# Altium footprint library Connectors.PcbLib: 135 footprints (part 9 of 9)
Each footprint in its own frame and in the unit in brackets; x right, y up, seen from the top. Pads: shape width x height; smd on the part's side, far side on the other; paste and mask are expansions set on the pad; w line width, h text height; cw(c..) or ccw(c..) is an arc to the next point about the centre after c.
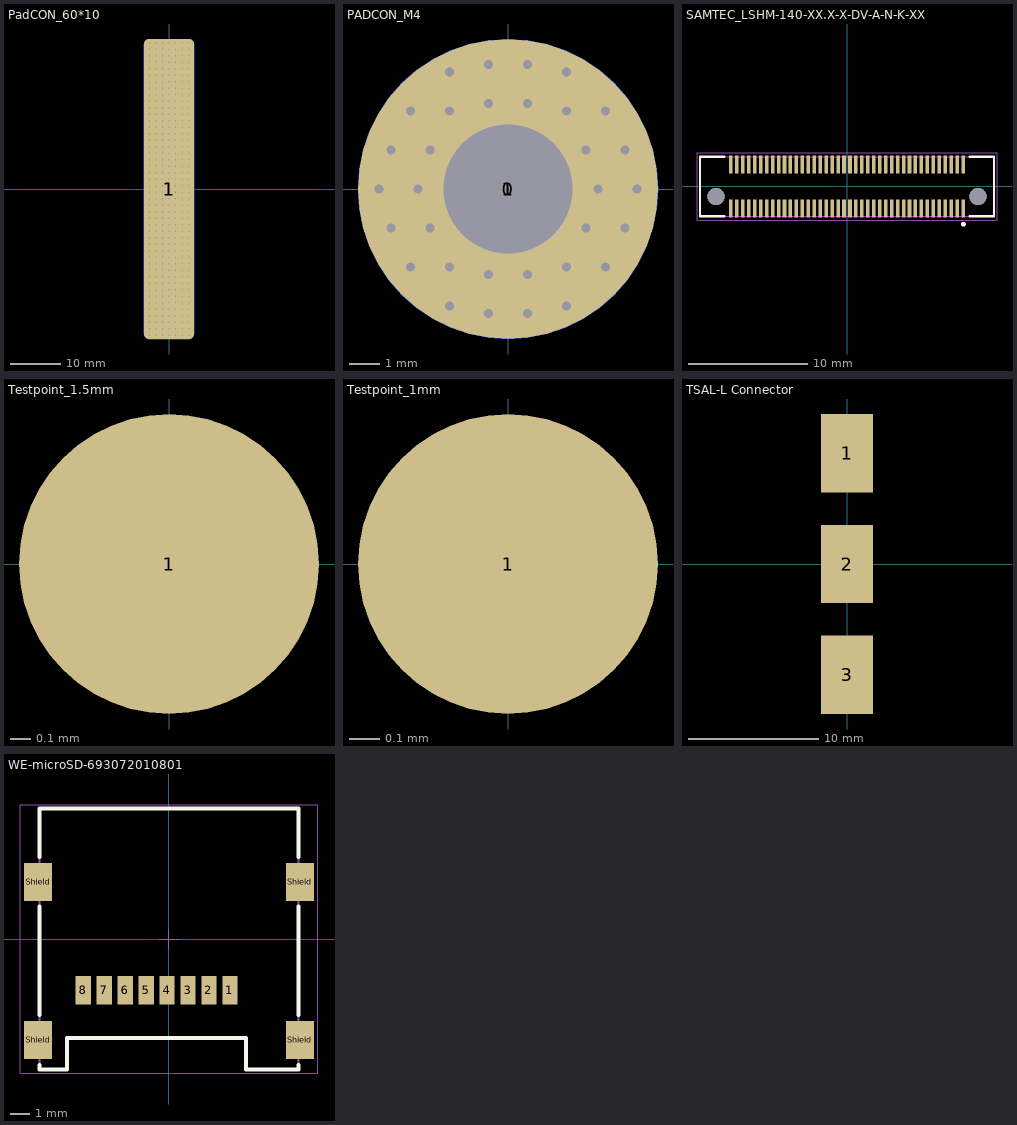
[diagram p8: the footprints below, top view; thin cyan lines are the x and y axes]

## PadCON_60*10 [mm]
pads (2):
  rrect20% 10x60 smd far side: 1(-0.025,0)
  rrect20% 10x60 smd: 1(-0.025,0)
via -0.05,0.625 diameter 0.65 hole 0.3
via 3.875,-29.25 diameter 0.65 hole 0.3
via 3.875,-27.95 diameter 0.65 hole 0.3
via 3.875,-26.65 diameter 0.65 hole 0.3
via 3.875,-25.35 diameter 0.65 hole 0.3
via 3.875,-24.05 diameter 0.65 hole 0.3
via 3.875,-22.75 diameter 0.65 hole 0.3
via 3.875,-21.45 diameter 0.65 hole 0.3
via -3.925,-29.25 diameter 0.65 hole 0.3
via -3.925,-27.95 diameter 0.65 hole 0.3
via -3.925,-26.65 diameter 0.65 hole 0.3
via -3.925,-25.35 diameter 0.65 hole 0.3
via -3.925,-24.05 diameter 0.65 hole 0.3
via -3.925,-22.75 diameter 0.65 hole 0.3
via -3.925,-21.45 diameter 0.65 hole 0.3
via 2.575,-29.25 diameter 0.65 hole 0.3
via 2.575,-27.95 diameter 0.65 hole 0.3
via 2.575,-26.65 diameter 0.65 hole 0.3
via 2.575,-25.35 diameter 0.65 hole 0.3
via 2.575,-24.05 diameter 0.65 hole 0.3
via 2.575,-22.75 diameter 0.65 hole 0.3
via 2.575,-21.45 diameter 0.65 hole 0.3
via -2.625,-29.25 diameter 0.65 hole 0.3
via -1.325,-29.25 diameter 0.65 hole 0.3
via -0.025,-29.25 diameter 0.65 hole 0.3
via 1.275,-29.25 diameter 0.65 hole 0.3
via -2.625,-27.95 diameter 0.65 hole 0.3
via -1.325,-27.95 diameter 0.65 hole 0.3
via -0.025,-27.95 diameter 0.65 hole 0.3
via 1.275,-27.95 diameter 0.65 hole 0.3
via -2.625,-26.65 diameter 0.65 hole 0.3
via -1.325,-26.65 diameter 0.65 hole 0.3
via -0.025,-26.65 diameter 0.65 hole 0.3
via 1.275,-26.65 diameter 0.65 hole 0.3
via -2.625,-25.35 diameter 0.65 hole 0.3
via -1.325,-25.35 diameter 0.65 hole 0.3
via -0.025,-25.35 diameter 0.65 hole 0.3
via 1.275,-25.35 diameter 0.65 hole 0.3
via -2.625,-24.05 diameter 0.65 hole 0.3
via -1.325,-24.05 diameter 0.65 hole 0.3
via -0.025,-24.05 diameter 0.65 hole 0.3
via 1.275,-24.05 diameter 0.65 hole 0.3
via -2.625,-22.75 diameter 0.65 hole 0.3
via -1.325,-22.75 diameter 0.65 hole 0.3
via -0.025,-22.75 diameter 0.65 hole 0.3
via 1.275,-22.75 diameter 0.65 hole 0.3
via -2.625,-21.45 diameter 0.65 hole 0.3
via -1.325,-21.45 diameter 0.65 hole 0.3
via -0.025,-21.45 diameter 0.65 hole 0.3
via 1.275,-21.45 diameter 0.65 hole 0.3
via 3.875,-20.15 diameter 0.65 hole 0.3
via 3.875,-18.85 diameter 0.65 hole 0.3
via 3.875,-17.55 diameter 0.65 hole 0.3
via 3.875,-16.25 diameter 0.65 hole 0.3
via 3.875,-14.95 diameter 0.65 hole 0.3
via 3.875,-13.65 diameter 0.65 hole 0.3
via 3.875,-12.35 diameter 0.65 hole 0.3
via 3.875,-11.05 diameter 0.65 hole 0.3
via -3.925,-20.15 diameter 0.65 hole 0.3
via -3.925,-18.85 diameter 0.65 hole 0.3
via -3.925,-17.55 diameter 0.65 hole 0.3
via -3.925,-16.25 diameter 0.65 hole 0.3
via -3.925,-14.95 diameter 0.65 hole 0.3
via -3.925,-13.65 diameter 0.65 hole 0.3
via -3.925,-12.35 diameter 0.65 hole 0.3
via -3.925,-11.05 diameter 0.65 hole 0.3
via 2.575,-20.15 diameter 0.65 hole 0.3
via 2.575,-18.85 diameter 0.65 hole 0.3
via 2.575,-17.55 diameter 0.65 hole 0.3
via 2.575,-16.25 diameter 0.65 hole 0.3
via 2.575,-14.95 diameter 0.65 hole 0.3
via 2.575,-13.65 diameter 0.65 hole 0.3
via 2.575,-12.35 diameter 0.65 hole 0.3
via 2.575,-11.05 diameter 0.65 hole 0.3
via -2.625,-20.15 diameter 0.65 hole 0.3
via -1.325,-20.15 diameter 0.65 hole 0.3
via -0.025,-20.15 diameter 0.65 hole 0.3
via 1.275,-20.15 diameter 0.65 hole 0.3
via -2.625,-18.85 diameter 0.65 hole 0.3
via -1.325,-18.85 diameter 0.65 hole 0.3
via -0.025,-18.85 diameter 0.65 hole 0.3
via 1.275,-18.85 diameter 0.65 hole 0.3
via -2.625,-17.55 diameter 0.65 hole 0.3
via -1.325,-17.55 diameter 0.65 hole 0.3
via -0.025,-17.55 diameter 0.65 hole 0.3
via 1.275,-17.55 diameter 0.65 hole 0.3
via -2.625,-16.25 diameter 0.65 hole 0.3
via -1.325,-16.25 diameter 0.65 hole 0.3
via -0.025,-16.25 diameter 0.65 hole 0.3
via 1.275,-16.25 diameter 0.65 hole 0.3
via -2.625,-14.95 diameter 0.65 hole 0.3
via -1.325,-14.95 diameter 0.65 hole 0.3
via -0.025,-14.95 diameter 0.65 hole 0.3
via 1.275,-14.95 diameter 0.65 hole 0.3
via -2.625,-13.65 diameter 0.65 hole 0.3
via -1.325,-13.65 diameter 0.65 hole 0.3
via -0.025,-13.65 diameter 0.65 hole 0.3
via 1.275,-13.65 diameter 0.65 hole 0.3
via -2.625,-12.35 diameter 0.65 hole 0.3
via -1.325,-12.35 diameter 0.65 hole 0.3
via -0.025,-12.35 diameter 0.65 hole 0.3
via 1.275,-12.35 diameter 0.65 hole 0.3
via -2.625,-11.05 diameter 0.65 hole 0.3
via -1.325,-11.05 diameter 0.65 hole 0.3
via -0.025,-11.05 diameter 0.65 hole 0.3
via 1.275,-11.05 diameter 0.65 hole 0.3
via 3.875,-9.75 diameter 0.65 hole 0.3
via 3.875,-8.45 diameter 0.65 hole 0.3
via 3.875,-7.15 diameter 0.65 hole 0.3
via 3.875,-5.85 diameter 0.65 hole 0.3
via 3.875,-4.55 diameter 0.65 hole 0.3
via 3.875,-3.25 diameter 0.65 hole 0.3
via 3.875,-1.95 diameter 0.65 hole 0.3
via 3.875,-0.65 diameter 0.65 hole 0.3
via -3.925,-9.75 diameter 0.65 hole 0.3
via -3.925,-8.45 diameter 0.65 hole 0.3
via -3.925,-7.15 diameter 0.65 hole 0.3
via -3.925,-5.85 diameter 0.65 hole 0.3
via -3.925,-4.55 diameter 0.65 hole 0.3
via -3.925,-3.25 diameter 0.65 hole 0.3
via -3.925,-1.95 diameter 0.65 hole 0.3
via -3.925,-0.65 diameter 0.65 hole 0.3
via 2.575,-9.75 diameter 0.65 hole 0.3
via 2.575,-8.45 diameter 0.65 hole 0.3
via 2.575,-7.15 diameter 0.65 hole 0.3
via 2.575,-5.85 diameter 0.65 hole 0.3
via 2.575,-4.55 diameter 0.65 hole 0.3
via 2.575,-3.25 diameter 0.65 hole 0.3
via 2.575,-1.95 diameter 0.65 hole 0.3
via 2.575,-0.65 diameter 0.65 hole 0.3
via -2.625,-9.75 diameter 0.65 hole 0.3
via -1.325,-9.75 diameter 0.65 hole 0.3
via -0.025,-9.75 diameter 0.65 hole 0.3
via 1.275,-9.75 diameter 0.65 hole 0.3
via -2.625,-8.45 diameter 0.65 hole 0.3
via -1.325,-8.45 diameter 0.65 hole 0.3
via -0.025,-8.45 diameter 0.65 hole 0.3
via 1.275,-8.45 diameter 0.65 hole 0.3
via -2.625,-7.15 diameter 0.65 hole 0.3
via -1.325,-7.15 diameter 0.65 hole 0.3
via -0.025,-7.15 diameter 0.65 hole 0.3
via 1.275,-7.15 diameter 0.65 hole 0.3
via -2.625,-5.85 diameter 0.65 hole 0.3
via -1.325,-5.85 diameter 0.65 hole 0.3
via -0.025,-5.85 diameter 0.65 hole 0.3
via 1.275,-5.85 diameter 0.65 hole 0.3
via -2.625,-4.55 diameter 0.65 hole 0.3
via -1.325,-4.55 diameter 0.65 hole 0.3
via -0.025,-4.55 diameter 0.65 hole 0.3
via 1.275,-4.55 diameter 0.65 hole 0.3
via -2.625,-3.25 diameter 0.65 hole 0.3
via -1.325,-3.25 diameter 0.65 hole 0.3
via -0.025,-3.25 diameter 0.65 hole 0.3
via 1.275,-3.25 diameter 0.65 hole 0.3
via -2.625,-1.95 diameter 0.65 hole 0.3
via -1.325,-1.95 diameter 0.65 hole 0.3
via -0.025,-1.95 diameter 0.65 hole 0.3
via 1.275,-1.95 diameter 0.65 hole 0.3
via -2.625,-0.65 diameter 0.65 hole 0.3
via -1.325,-0.65 diameter 0.65 hole 0.3
via -0.025,-0.65 diameter 0.65 hole 0.3
via 1.275,-0.65 diameter 0.65 hole 0.3
via 3.875,0.65 diameter 0.65 hole 0.3
via 3.875,1.95 diameter 0.65 hole 0.3
via 3.875,3.25 diameter 0.65 hole 0.3
via 3.875,4.55 diameter 0.65 hole 0.3
via 3.875,5.85 diameter 0.65 hole 0.3
via 3.875,7.15 diameter 0.65 hole 0.3
via 3.875,8.45 diameter 0.65 hole 0.3
via 3.875,9.75 diameter 0.65 hole 0.3
via -3.925,0.65 diameter 0.65 hole 0.3
via -3.925,1.95 diameter 0.65 hole 0.3
via -3.925,3.25 diameter 0.65 hole 0.3
via -3.925,4.55 diameter 0.65 hole 0.3
via -3.925,5.85 diameter 0.65 hole 0.3
via -3.925,7.15 diameter 0.65 hole 0.3
via -3.925,8.45 diameter 0.65 hole 0.3
via -3.925,9.75 diameter 0.65 hole 0.3
via 2.575,0.65 diameter 0.65 hole 0.3
via 2.575,1.95 diameter 0.65 hole 0.3
via 2.575,3.25 diameter 0.65 hole 0.3
via 2.575,4.55 diameter 0.65 hole 0.3
via 2.575,5.85 diameter 0.65 hole 0.3
via 2.575,7.15 diameter 0.65 hole 0.3
via 2.575,8.45 diameter 0.65 hole 0.3
via 2.575,9.75 diameter 0.65 hole 0.3
via -2.625,0.65 diameter 0.65 hole 0.3
via -1.325,0.65 diameter 0.65 hole 0.3
via 1.275,0.65 diameter 0.65 hole 0.3
via -2.625,1.95 diameter 0.65 hole 0.3
via -1.325,1.95 diameter 0.65 hole 0.3
via -0.025,1.95 diameter 0.65 hole 0.3
via 1.275,1.95 diameter 0.65 hole 0.3
via -2.625,3.25 diameter 0.65 hole 0.3
via -1.325,3.25 diameter 0.65 hole 0.3
via -0.025,3.25 diameter 0.65 hole 0.3
via 1.275,3.25 diameter 0.65 hole 0.3
via -2.625,4.55 diameter 0.65 hole 0.3
via -1.325,4.55 diameter 0.65 hole 0.3
via -0.025,4.55 diameter 0.65 hole 0.3
via 1.275,4.55 diameter 0.65 hole 0.3
via -2.625,5.85 diameter 0.65 hole 0.3
via -1.325,5.85 diameter 0.65 hole 0.3
via -0.025,5.85 diameter 0.65 hole 0.3
via 1.275,5.85 diameter 0.65 hole 0.3
via -2.625,7.15 diameter 0.65 hole 0.3
via -1.325,7.15 diameter 0.65 hole 0.3
via -0.025,7.15 diameter 0.65 hole 0.3
via 1.275,7.15 diameter 0.65 hole 0.3
via -2.625,8.45 diameter 0.65 hole 0.3
via -1.325,8.45 diameter 0.65 hole 0.3
via -0.025,8.45 diameter 0.65 hole 0.3
via 1.275,8.45 diameter 0.65 hole 0.3
via -2.625,9.75 diameter 0.65 hole 0.3
via -1.325,9.75 diameter 0.65 hole 0.3
via -0.025,9.75 diameter 0.65 hole 0.3
via 1.275,9.75 diameter 0.65 hole 0.3
via 3.875,11.05 diameter 0.65 hole 0.3
via 3.875,12.35 diameter 0.65 hole 0.3
via 3.875,13.65 diameter 0.65 hole 0.3
via 3.875,14.95 diameter 0.65 hole 0.3
via 3.875,16.25 diameter 0.65 hole 0.3
via 3.875,17.55 diameter 0.65 hole 0.3
via 3.875,18.85 diameter 0.65 hole 0.3
via 3.875,20.15 diameter 0.65 hole 0.3
via -3.925,11.05 diameter 0.65 hole 0.3
via -3.925,12.35 diameter 0.65 hole 0.3
via -3.925,13.65 diameter 0.65 hole 0.3
via -3.925,14.95 diameter 0.65 hole 0.3
via -3.925,16.25 diameter 0.65 hole 0.3
via -3.925,17.55 diameter 0.65 hole 0.3
via -3.925,18.85 diameter 0.65 hole 0.3
via -3.925,20.15 diameter 0.65 hole 0.3
via 2.575,11.05 diameter 0.65 hole 0.3
via 2.575,12.35 diameter 0.65 hole 0.3
via 2.575,13.65 diameter 0.65 hole 0.3
via 2.575,14.95 diameter 0.65 hole 0.3
via 2.575,16.25 diameter 0.65 hole 0.3
via 2.575,17.55 diameter 0.65 hole 0.3
via 2.575,18.85 diameter 0.65 hole 0.3
via 2.575,20.15 diameter 0.65 hole 0.3
via -2.625,11.05 diameter 0.65 hole 0.3
via -1.325,11.05 diameter 0.65 hole 0.3
via -0.025,11.05 diameter 0.65 hole 0.3
via 1.275,11.05 diameter 0.65 hole 0.3
via -2.625,12.35 diameter 0.65 hole 0.3
via -1.325,12.35 diameter 0.65 hole 0.3
via -0.025,12.35 diameter 0.65 hole 0.3
via 1.275,12.35 diameter 0.65 hole 0.3
via -2.625,13.65 diameter 0.65 hole 0.3
via -1.325,13.65 diameter 0.65 hole 0.3
via -0.025,13.65 diameter 0.65 hole 0.3
via 1.275,13.65 diameter 0.65 hole 0.3
via -2.625,14.95 diameter 0.65 hole 0.3
via -1.325,14.95 diameter 0.65 hole 0.3
via -0.025,14.95 diameter 0.65 hole 0.3
via 1.275,14.95 diameter 0.65 hole 0.3
via -2.625,16.25 diameter 0.65 hole 0.3
via -1.325,16.25 diameter 0.65 hole 0.3
via -0.025,16.25 diameter 0.65 hole 0.3
via 1.275,16.25 diameter 0.65 hole 0.3
via -2.625,17.55 diameter 0.65 hole 0.3
via -1.325,17.55 diameter 0.65 hole 0.3
via -0.025,17.55 diameter 0.65 hole 0.3
via 1.275,17.55 diameter 0.65 hole 0.3
via -2.625,18.85 diameter 0.65 hole 0.3
via -1.325,18.85 diameter 0.65 hole 0.3
via -0.025,18.85 diameter 0.65 hole 0.3
via 1.275,18.85 diameter 0.65 hole 0.3
via -2.625,20.15 diameter 0.65 hole 0.3
via -1.325,20.15 diameter 0.65 hole 0.3
via -0.025,20.15 diameter 0.65 hole 0.3
via 1.275,20.15 diameter 0.65 hole 0.3
via 3.875,21.45 diameter 0.65 hole 0.3
via 3.875,22.75 diameter 0.65 hole 0.3
via 3.875,24.05 diameter 0.65 hole 0.3
via 3.875,25.35 diameter 0.65 hole 0.3
via 3.875,26.65 diameter 0.65 hole 0.3
via 3.875,27.95 diameter 0.65 hole 0.3
via 3.875,29.25 diameter 0.65 hole 0.3
via -3.925,21.45 diameter 0.65 hole 0.3
via -3.925,22.75 diameter 0.65 hole 0.3
via -3.925,24.05 diameter 0.65 hole 0.3
via -3.925,25.35 diameter 0.65 hole 0.3
via -3.925,26.65 diameter 0.65 hole 0.3
via -3.925,27.95 diameter 0.65 hole 0.3
via -3.925,29.25 diameter 0.65 hole 0.3
via 2.575,21.45 diameter 0.65 hole 0.3
via 2.575,22.75 diameter 0.65 hole 0.3
via 2.575,24.05 diameter 0.65 hole 0.3
via 2.575,25.35 diameter 0.65 hole 0.3
via 2.575,26.65 diameter 0.65 hole 0.3
via 2.575,27.95 diameter 0.65 hole 0.3
via 2.575,29.25 diameter 0.65 hole 0.3
via -2.625,21.45 diameter 0.65 hole 0.3
via -1.325,21.45 diameter 0.65 hole 0.3
via -0.025,21.45 diameter 0.65 hole 0.3
via 1.275,21.45 diameter 0.65 hole 0.3
via -2.625,22.75 diameter 0.65 hole 0.3
via -1.325,22.75 diameter 0.65 hole 0.3
via -0.025,22.75 diameter 0.65 hole 0.3
via 1.275,22.75 diameter 0.65 hole 0.3
via -2.625,24.05 diameter 0.65 hole 0.3
via -1.325,24.05 diameter 0.65 hole 0.3
via -0.025,24.05 diameter 0.65 hole 0.3
via 1.275,24.05 diameter 0.65 hole 0.3
via -2.625,25.35 diameter 0.65 hole 0.3
via -1.325,25.35 diameter 0.65 hole 0.3
via -0.025,25.35 diameter 0.65 hole 0.3
via 1.275,25.35 diameter 0.65 hole 0.3
via -2.625,26.65 diameter 0.65 hole 0.3
via -1.325,26.65 diameter 0.65 hole 0.3
via -0.025,26.65 diameter 0.65 hole 0.3
via 1.275,26.65 diameter 0.65 hole 0.3
via -2.625,27.95 diameter 0.65 hole 0.3
via -1.325,27.95 diameter 0.65 hole 0.3
via -0.025,27.95 diameter 0.65 hole 0.3
via 1.275,27.95 diameter 0.65 hole 0.3
via -2.625,29.25 diameter 0.65 hole 0.3
via -1.325,29.25 diameter 0.65 hole 0.3
via -0.025,29.25 diameter 0.65 hole 0.3
via 1.275,29.25 diameter 0.65 hole 0.3

## PADCON_M4 [mm]
pads (3):
  round 1 hole 4.3: 0(0,0)
  round 10 smd far side: 1(0,0)
  round 10 smd: 1(0,0)
via 4.3,0 diameter 0.65 hole 0.3
via 3,0 diameter 0.65 hole 0.3
via 3.9,1.3 diameter 0.65 hole 0.3
via 2.6,1.3 diameter 0.65 hole 0.3
via 3.25,2.6 diameter 0.65 hole 0.3
via 1.95,2.6 diameter 0.65 hole 0.3
via 0.65,2.85 diameter 0.65 hole 0.3
via -0.65,2.85 diameter 0.65 hole 0.3
via -1.95,2.6 diameter 0.65 hole 0.3
via -3.25,2.6 diameter 0.65 hole 0.3
via 1.95,3.9 diameter 0.65 hole 0.3
via 0.65,4.15 diameter 0.65 hole 0.3
via -0.65,4.15 diameter 0.65 hole 0.3
via -1.95,3.9 diameter 0.65 hole 0.3
via 3.9,-1.3 diameter 0.65 hole 0.3
via 2.6,-1.3 diameter 0.65 hole 0.3
via 1.95,-3.9 diameter 0.65 hole 0.3
via 0.65,-4.15 diameter 0.65 hole 0.3
via -0.65,-4.15 diameter 0.65 hole 0.3
via -1.95,-3.9 diameter 0.65 hole 0.3
via 3.25,-2.6 diameter 0.65 hole 0.3
via 1.95,-2.6 diameter 0.65 hole 0.3
via 0.65,-2.85 diameter 0.65 hole 0.3
via -0.65,-2.85 diameter 0.65 hole 0.3
via -1.95,-2.6 diameter 0.65 hole 0.3
via -3.25,-2.6 diameter 0.65 hole 0.3
via -4.3,0 diameter 0.65 hole 0.3
via -3,0 diameter 0.65 hole 0.3
via -3.9,-1.3 diameter 0.65 hole 0.3
via -2.6,-1.3 diameter 0.65 hole 0.3
via -3.9,1.3 diameter 0.65 hole 0.3
via -2.6,1.3 diameter 0.65 hole 0.3

## SAMTEC_LSHM-140-XX.X-X-DV-A-N-K-XX [mm]
pads (82):
  rect 0.3x1.5 smd: 01(9.75,-1.85) 02(9.75,1.85) 03(9.25,-1.85) 04(9.25,1.85) 05(8.75,-1.85) 06(8.75,1.85) 07(8.25,-1.85) 08(8.25,1.85) 09(7.75,-1.85) 10(7.75,1.85) 11(7.25,-1.85) 12(7.25,1.85) 13(6.75,-1.85) 14(6.75,1.85) 15(6.25,-1.85) 16(6.25,1.85) 17(5.75,-1.85) 18(5.75,1.85) 19(5.25,-1.85) 20(5.25,1.85) 21(4.75,-1.85) 22(4.75,1.85) 23(4.25,-1.85) 24(4.25,1.85) 25(3.75,-1.85) 26(3.75,1.85) 27(3.25,-1.85) 28(3.25,1.85) 29(2.75,-1.85) 30(2.75,1.85) 31(2.25,-1.85) 32(2.25,1.85) 33(1.75,-1.85) 34(1.75,1.85) 35(1.25,-1.85) 36(1.25,1.85) 37(0.75,-1.85) 38(0.75,1.85) 39(0.25,-1.85) 40(0.25,1.85) 41(-0.25,-1.85) 42(-0.25,1.85) 43(-0.75,-1.85) 44(-0.75,1.85) 45(-1.25,-1.85) 46(-1.25,1.85) 47(-1.75,-1.85) 48(-1.75,1.85) 49(-2.25,-1.85) 50(-2.25,1.85) 51(-2.75,-1.85) 52(-2.75,1.85) 53(-3.25,-1.85) 54(-3.25,1.85) 55(-3.75,-1.85) 56(-3.75,1.85) 57(-4.25,-1.85) 58(-4.25,1.85) 59(-4.75,-1.85) 60(-4.75,1.85) 61(-5.25,-1.85) 62(-5.25,1.85) 63(-5.75,-1.85) 64(-5.75,1.85) 65(-6.25,-1.85) 66(-6.25,1.85) 67(-6.75,-1.85) 68(-6.75,1.85) 69(-7.25,-1.85) 70(-7.25,1.85) 71(-7.75,-1.85) 72(-7.75,1.85) 73(-8.25,-1.85) 74(-8.25,1.85) 75(-8.75,-1.85) 76(-8.75,1.85) 77(-9.25,-1.85) 78(-9.25,1.85) 79(-9.75,-1.85) 80(-9.75,1.85)
  round 1.45 hole 1.45 unplated: ""(-11,-0.85) ""(11,-0.85)
Top Overlay:
  circle w0.2: c9.779,-3.175 r0.1
  lines w0.2: -10.3,-2.49 -12.35,-2.49 -12.35,2.49 -10.3,2.49 ; 10.3,-2.49 12.35,-2.49 12.35,2.49 10.3,2.49
Top Component Outline:
  lines w0.1: -12.35,-2.49 -12.35,2.49 12.35,2.49 12.35,-2.49 -12.35,-2.49
Top Courtyard (Mech26):
  lines w0.05: -12.6,-2.85 -12.6,2.85 12.6,2.85 12.6,-2.85 -12.6,-2.85
3D body "LSHM-140-02.5-L-DV-A-N-K-TR.stp": height 4.07, standoff -0.88, extent -12.4,-2.49 12.4,2.49

## Testpoint_1.5mm [mm] "Testpoint mit einem Durchmesser von 1.5mm"
pads (1):
  round 1.5 smd: 1(0,0)

## Testpoint_1mm [mm] "Testpoint mit einem Durchmesser von 1mm"
pads (1):
  round 1 smd: 1(0,0)

## TSAL-L Connector [mm]
height 2
pads (3):
  rect 4x6 smd paste+0 mask+0: 1(0,8.5) 2(0,0) 3(0,-8.5)

## WE-microSD-693072010801 [mm] "Micro SD Card Connector Hinge - 8 Pins"
height 1.75
pads (12):
  rect 0.8x1.5 smd: 1(3.2,-2.7) 2(2.1,-2.7) 3(1,-2.7) 4(-0.1,-2.7) 5(-1.2,-2.7) 6(-2.3,-2.7) 7(-3.4,-2.7) 8(-4.5,-2.7)
  rect 1.45x2 smd: Shield(-6.875,-5.3) Shield(-6.875,3) Shield(6.875,-5.3) Shield(6.875,3)
Top Overlay:
  lines w0.2: -6.8,-6.6 -6.8,-6.85 -5.35,-6.85 -5.35,-5.2 4.05,-5.2 4.05,-6.85 6.8,-6.85 6.8,-6.6 ; -6.8,-4 -6.8,1.7 ; -6.8,4.3 -6.8,6.85 6.8,6.85 6.8,4.3 ; 6.8,-4 6.8,1.7
Top Component Center:
  lines w0.05: -0.5,0 0.5,0 ; 0,-0.5 0,0.5
Top Component Outline:
  lines w0.1: -6.8,-6.85 -5.35,-6.85 -5.35,-5.2 4.05,-5.2 4.05,-6.85 6.8,-6.85 6.8,6.85 -6.8,6.85 -6.8,-6.85
Top Courtyard (Mech26):
  lines w0.05: -7.8,-7.05 7.8,-7.05 7.8,7.05 -7.8,7.05 -7.8,-7.05
3D body "693072010801.stp": height 1.79, standoff 0.02, extent -7.25,-6.85 7.25,6.85